# Altium footprint library VESC_MotorController.PcbLib: 64 footprints (part 1 of 4)
Each footprint in its own frame and in the unit in brackets; x right, y up, seen from the top. Pads: shape width x height; smd on the part's side, far side on the other; paste and mask are expansions set on the pad; w line width, h text height; cw(c..) or ccw(c..) is an arc to the next point about the centre after c.
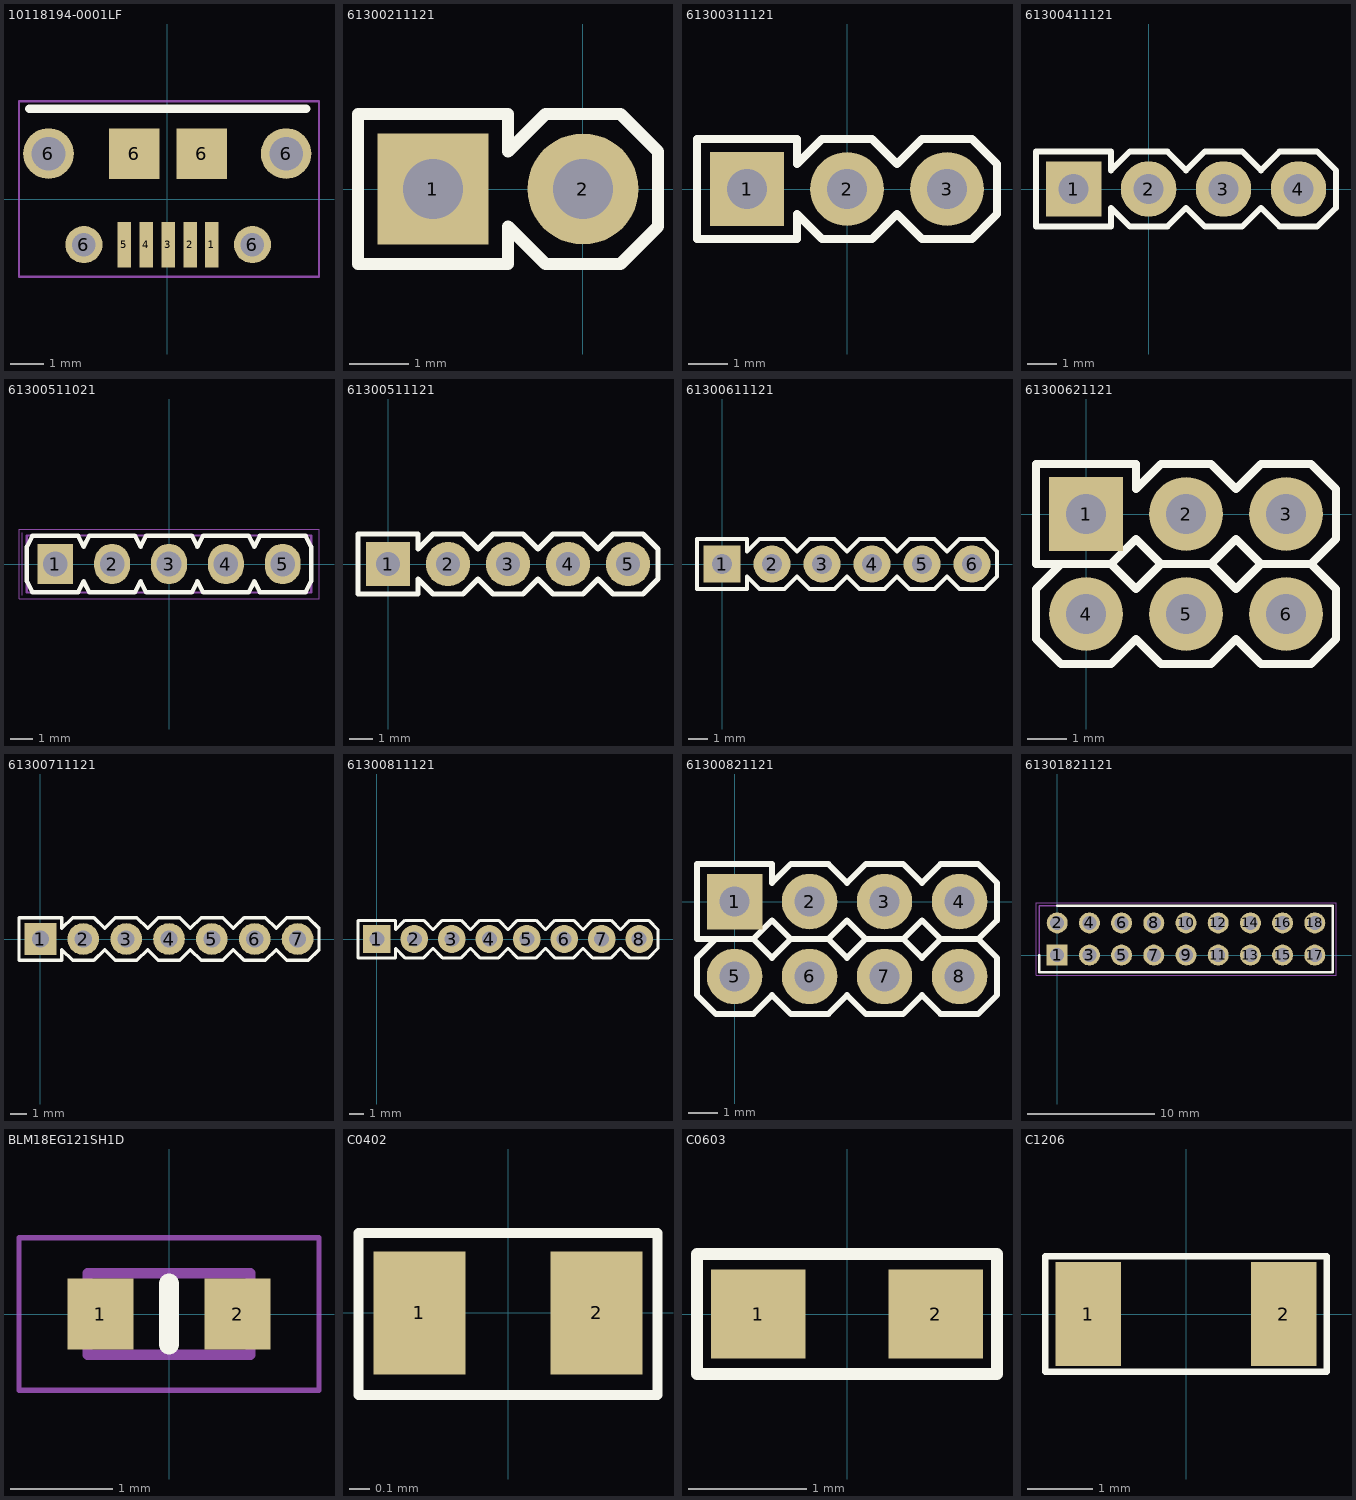
[diagram p0: the footprints below, top view; thin cyan lines are the x and y axes]

## 10118194-0001LF [mm] "CONN USB MICRO B RECPT SMT R/A"
pads (11):
  rect 0.4x1.35 smd: 1(1.325,-1.35) 2(0.675,-1.35) 3(0.025,-1.35) 4(-0.625,-1.35) 5(-1.275,-1.35)
  round 1.5 hole 1: 6(-3.525,1.35) 6(3.525,1.35)
  round 1.1 hole 0.7: 6(-2.475,-1.35) 6(2.525,-1.35)
  rect 1.5x1.5 smd: 6(-0.975,1.35) 6(1.025,1.35)
Top Overlay:
  lines w0.25: -4.1,2.675 4.125,2.675
Mechanical 15:
  lines w0.07: -4.4,-2.3 -4.4,2.9 4.5,2.9 4.5,-2.3 -4.4,-2.3
3D body "MICRO_USB_5PIN_0921_ASM.STEP": height 2.73, standoff -0.55, extent -4,-1.553 4.05,4.027

## 61300211121 [mil]
pads (2):
  rect 74x74 hole 40: 1(-100,0)
  round 74 hole 40: 2(0,0)
Top Overlay:
  lines w8: -150,-50 -50,-50 -50,-25 -25,-50 25,-50 50,-25 50,25 25,50 -25,50 -50,25 -50,50 -150,50 -150,-50
Mechanical 13:
  region: -90,-10 -110,-10 -110,10 -90,10
  region: 10,-10 -10,-10 -10,10 10,10
3D body "61300211121.stp": height 286.22, standoff -168.11, extent -149.99,-49.99 50.01,50.01

## 61300311121 [mil]
pads (3):
  rect 74x74 hole 40: 1(-100,0)
  round 74 hole 40: 2(0,0) 3(100,0)
Top Overlay:
  lines w8: -150,-50 -150,50 -50,50 -50,25 -25,50 25,50 50,25 75,50 125,50 150,25 150,-25 125,-50 75,-50 50,-25 25,-50 -25,-50 -50,-25 -50,-50 -150,-50
Mechanical 13:
  region: 110,-10 90,-10 90,10 110,10
  region: 10,-10 -10,-10 -10,10 10,10
  region: -90,-10 -110,-10 -110,10 -90,10
3D body "61300311121.stp": height 341.34, standoff -112.99, extent -150,-49.99 150,50.01

## 61300411121 [mil]
pads (4):
  rect 74x74 hole 40: 1(-100,0)
  round 74 hole 40: 2(0,0) 3(100,0) 4(200,0)
Top Overlay:
  lines w8: -150,-50 -50,-50 -50,-25 -25,-50 25,-50 50,-25 75,-50 125,-50 150,-25 175,-50 225,-50 250,-25 250,25 225,50 175,50 150,25 125,50 75,50 50,25 25,50 -25,50 -50,25 -50,50 -150,50 -150,-50
Mechanical 13:
  region: -90,-10 -110,-10 -110,10 -90,10
  region: 10,-10 -10,-10 -10,10 10,10
  region: 110,-10 90,-10 90,10 110,10
  region: 210,-10 190,-10 190,10 210,10
3D body "61300411121.stp": height 341.34, standoff -112.99, extent -149.99,-49.99 250.01,50.01

## 61300511021 [mm] "Pin Header, pitch 2.54 mm, THT, Vertical, single row, 5p"
height 8.54
pads (5):
  rect 1.6x1.8 hole 1.1: 1(-5.08,0)
  oval 1.6x1.8 hole 1.1: 2(-2.54,0) 3(0,0) 4(2.54,0) 5(5.08,0)
Top Overlay:
  lines w0.2: -6.35,-0.77 -6.1,-1.27 -4.06,-1.27 -3.81,-0.77 -3.56,-1.27 -1.52,-1.27 -1.27,-0.77 -1.02,-1.27 1.02,-1.27 1.27,-0.77 1.52,-1.27 3.56,-1.27 3.81,-0.77 4.06,-1.27 6.1,-1.27 6.35,-0.77 6.35,0.77 6.1,1.27 4.06,1.27 3.81,0.77 3.56,1.27 1.52,1.27 1.27,0.77 1.02,1.27 -1.02,1.27 -1.27,0.77 -1.52,1.27 -3.56,1.27 -3.81,0.77 -4.06,1.27 -6.1,1.27 -6.35,0.77 -6.35,-0.77
Mechanical 13:
  lines w0.1: 6.1,-1.27 4.06,-1.27 3.81,-0.77 3.56,-1.27 1.52,-1.27 1.27,-0.77 1.02,-1.27 -1.02,-1.27 -1.27,-0.77 -1.52,-1.27 -3.56,-1.27 -3.81,-0.77 -4.06,-1.27 -6.1,-1.27 -6.35,-0.77 -6.35,0.77 -6.1,1.27 -4.06,1.27 -3.81,0.77 -3.56,1.27 -1.52,1.27 -1.27,0.77 -1.02,1.27 1.02,1.27 1.27,0.77 1.52,1.27 3.56,1.27 3.81,0.77 4.06,1.27 6.1,1.27 ; -6.35,-1.27 -6.35,1.27 6.35,1.27 6.35,-1.27 -6.35,-1.27
Mechanical 14:
  text ".Designator" at -0.309,-0.098 h0.75
Mechanical 15:
  lines w0.05: -6.55,-1.4 -6.55,1.4 ; -0.5,0 0.5,0 ; 0,-0.5 0,0.5 ; -6.7,-1.545 -6.7,1.545 6.7,1.545 6.7,-1.545 -6.7,-1.545
3D body "61300511021 (rev1).stp": height 2.55, standoff -2.99, extent -6.35,-0.423 6.35,9.937

## 61300511121 [mil]
pads (5):
  rect 74x74 hole 40: 1(0,0)
  round 74 hole 40: 2(100,0) 3(200,0) 4(300,0) 5(400,0)
Top Overlay:
  lines w8: -50,-50 50,-50 50,-25 75,-50 125,-50 150,-25 175,-50 225,-50 250,-25 275,-50 325,-50 350,-25 375,-50 425,-50 450,-25 450,25 425,50 375,50 350,25 325,50 275,50 250,25 225,50 175,50 150,25 125,50 75,50 50,25 50,50 -50,50 -50,-50
3D body "61300511121.stp": height 341.34, standoff -112.99, extent -49.99,-49.99 450.01,50.01

## 61300611121 [mil]
pads (6):
  rect 74x74 hole 40: 1(0,0)
  round 74 hole 40: 2(100,0) 3(200,0) 4(300,0) 5(400,0) 6(500,0)
Top Overlay:
  lines w8: -50,-50 50,-50 50,-25 75,-50 125,-50 150,-25 175,-50 225,-50 250,-25 275,-50 325,-50 350,-25 375,-50 425,-50 450,-25 475,-50 525,-50 550,-25 550,25 525,50 475,50 450,25 425,50 375,50 350,25 325,50 275,50 250,25 225,50 175,50 150,25 125,50 75,50 50,25 50,50 -50,50 -50,-50
3D body "61300611121.stp": height 342.13, standoff -125.98, extent -50,-50 550,50

## 61300621121 [mil]
pads (6):
  rect 74x74 hole 40: 1(0,0)
  round 74 hole 40: 2(100,0) 3(200,0) 4(0,-100) 5(100,-100) 6(200,-100)
Top Overlay:
  lines w8: -25,-50 -50,-75 -50,-125 -25,-150 25,-150 50,-125 75,-150 125,-150 150,-125 175,-150 225,-150 250,-125 250,-75 225,-50 ; 25,-50 50,-75 75,-50 ; 25,-50 -50,-50 -50,50 50,50 50,25 75,50 125,50 150,25 175,50 225,50 250,25 250,-25 225,-50 ; 25,-50 50,-25 75,-50 ; 75,-50 125,-50 ; 125,-50 150,-75 175,-50 ; 125,-50 150,-25 175,-50 ; 175,-50 225,-50
3D body "61300621121.stp": height 350, standoff -125.98, extent -50,-150 250,50

## 61300711121 [mil]
pads (7):
  rect 74x74 hole 40: 1(0,0)
  round 74 hole 40: 2(100,0) 3(200,0) 4(300,0) 5(400,0) 6(500,0) 7(600,0)
Top Overlay:
  lines w8: -50,-50 50,-50 50,-25 75,-50 125,-50 150,-25 175,-50 225,-50 250,-25 275,-50 325,-50 350,-25 375,-50 425,-50 450,-25 475,-50 525,-50 550,-25 575,-50 625,-50 650,-25 650,25 625,50 575,50 550,25 525,50 475,50 450,25 425,50 375,50 350,25 325,50 275,50 250,25 225,50 175,50 150,25 125,50 75,50 50,25 50,50 -50,50 -50,-50
3D body "61300711121.stp": height 342.13, standoff -125.98, extent -50,-50 650,50

## 61300811121 [mil]
pads (8):
  rect 74x74 hole 40: 1(0,0)
  round 74 hole 40: 2(100,0) 3(200,0) 4(300,0) 5(400,0) 6(500,0) 7(600,0) 8(700,0)
Top Overlay:
  lines w8: -50,-50 -50,50 50,50 50,25 75,50 125,50 150,25 175,50 225,50 250,25 275,50 325,50 350,25 375,50 425,50 450,25 475,50 525,50 550,25 575,50 625,50 650,25 675,50 725,50 750,25 750,-25 725,-50 675,-50 650,-25 625,-50 575,-50 550,-25 525,-50 475,-50 450,-25 425,-50 375,-50 350,-25 325,-50 275,-50 250,-25 225,-50 175,-50 150,-25 125,-50 75,-50 50,-25 50,-50 -50,-50
3D body "61300811121.stp": height 336.22, standoff -118.11, extent -50,-50 750,50

## 61300821121 [mil]
pads (8):
  rect 74x74 hole 40: 1(0,0)
  round 74 hole 40: 2(100,0) 3(200,0) 4(300,0) 5(0,-100) 6(100,-100) 7(200,-100) 8(300,-100)
Top Overlay:
  lines w8: -25,-50 -50,-75 -50,-125 -25,-150 25,-150 50,-125 75,-150 125,-150 150,-125 175,-150 225,-150 250,-125 275,-150 325,-150 350,-125 350,-75 325,-50 ; 25,-50 50,-25 75,-50 ; 25,-50 -50,-50 -50,50 50,50 50,25 75,50 125,50 150,25 175,50 225,50 250,25 275,50 325,50 350,25 350,-25 325,-50 ; 25,-50 50,-75 75,-50 ; 75,-50 125,-50 ; 125,-50 150,-25 175,-50 ; 125,-50 150,-75 175,-50 ; 175,-50 225,-50 ; 225,-50 250,-25 275,-50 ; 225,-50 250,-75 275,-50 ; 275,-50 325,-50
3D body "61300821121.stp": height 118.11, standoff -336.22, extent -50,-150 350,50

## 61301821121 [mm]
pads (18):
  rect 1.65x1.65 / inner round 1.65 / far side rect 1.65x1.65 hole 1.1: 1(0,0)
  round 1.65 hole 1.1: 2(0,2.54) 3(2.54,0) 4(2.54,2.54) 5(5.08,0) 6(5.08,2.54) 7(7.62,0) 8(7.62,2.54) 9(10.16,0) 10(10.16,2.54) 11(12.7,0) 12(12.7,2.54) 13(15.24,0) 14(15.24,2.54) 15(17.78,0) 16(17.78,2.54) 17(20.32,0) 18(20.32,2.54)
Top Overlay:
  lines w0.2: -1.42,0 -1.42,-1.345 21.74,-1.345 21.74,3.885 0,3.885
Mechanical 15:
  lines w0.1: -1.42,-1.345 21.74,-1.345 21.74,3.885 -1.42,3.885 -1.42,-1.345
Mechanical 16:
  lines w0.05: -1.67,-1.595 21.99,-1.595 21.99,4.135 -1.67,4.135 -1.67,-1.595
3D body "61301821121.stp": height 8.69, standoff -3.2, extent -1.27,-1.27 21.59,3.81

## BLM18EG121SH1D [mm]
pads (2):
  rect 0.65x0.7 smd: 1(-0.675,0) 2(0.675,0)
Top Overlay:
  lines w0.2: 0,-0.3 0,0.3
Mechanical 15:
  lines w0.1: -0.8,-0.4 0.8,-0.4 0.8,0.4 -0.8,0.4 -0.8,-0.4
Mechanical 20:
  lines w0.05: -1.475,-0.75 1.475,-0.75 1.475,0.75 -1.475,0.75 -1.475,-0.75
3D body "BLM18AG102SN1D.stp": height 0.81, standoff 0.01, extent -0.8,-0.406 0.8,0.394

## C0402 [mm]
pads (2):
  rect 0.45x0.6 smd: 1(-0.432,0) 2(0.432,0)
Top Overlay:
  lines w0.05: -0.73,-0.4 0.73,-0.4 0.73,0.39 -0.73,0.39 -0.73,-0.4
3D body "GQM1555C2D9R5BB01J--3DModel-STEP-56544.STEP": height 0.5, standoff 0, extent -0.49,-0.27 0.51,0.28

## C0603 [mm] "CAPACITOR SMD 0603"
height 0.9
pads (2):
  rect 0.8x0.75 smd: 1(-0.75,0) 2(0.75,0)
Top Overlay:
  lines w0.1: -1.27,-0.508 -1.27,0.508 1.27,0.508 1.27,-0.508 -1.27,-0.508
3D body "User Library-0603(1608M) Cap.STEP": height 0.79, standoff 0, extent -1,-0.394 1,0.394

## C1206 [mm] "CAPACITOR SMD 1206"
height 0.94
pads (2):
  rect 1x1.6 smd: 1(-1.5,0) 2(1.5,0)
Top Overlay:
  lines w0.1: -2.159,-0.889 -2.159,0.889 2.159,0.889 2.159,-0.889 -2.159,-0.889
3D body "User Library-1206(3216M) Cap.STEP": height 1.53, standoff 0, extent -2,-0.8 2,0.8